# Altium footprint library FOOTPRINTS_tracker.PcbLib: 29 footprints (part 2 of 2)
Each footprint in its own frame and in the unit in brackets; x right, y up, seen from the top. Pads: shape width x height; smd on the part's side, far side on the other; paste and mask are expansions set on the pad; w line width, h text height; cw(c..) or ccw(c..) is an arc to the next point about the centre after c.
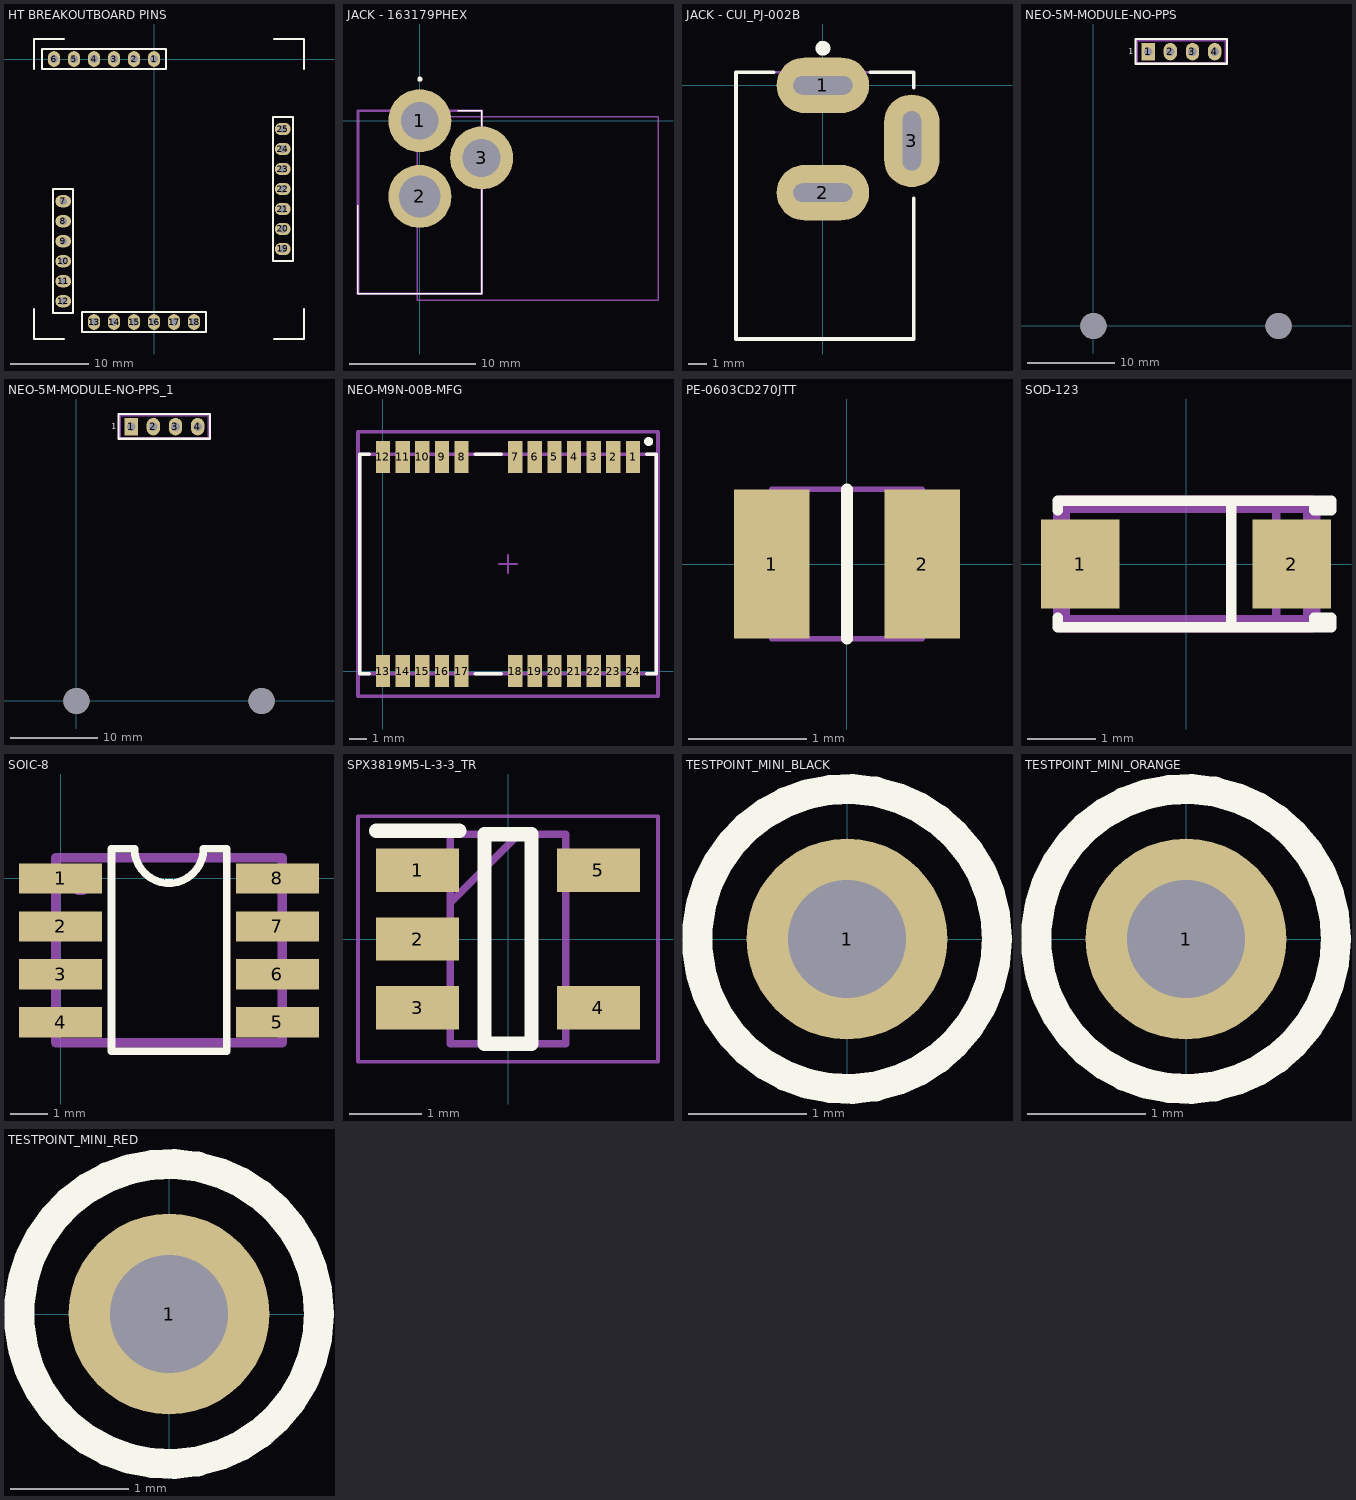
[diagram p1: the footprints below, top view; thin cyan lines are the x and y axes]

## HT BREAKOUTBOARD PINS [mm]
pads (25):
  oval 1.54x2 hole 1: 1(0,0) 2(-2.54,0) 3(-5.08,0) 4(-7.62,0) 5(-10.16,0) 6(-12.7,0) 13(-7.62,-33.401) 14(-5.08,-33.401) 15(-2.54,-33.401) 16(0,-33.401) 17(2.54,-33.401) 18(5.08,-33.401)
  oval 2x1.54 hole 1: 7(-11.532,-18.059) 8(-11.532,-20.599) 9(-11.532,-23.139) 10(-11.532,-25.679) 11(-11.532,-28.219) 12(-11.532,-30.759) 19(16.358,-24.13) 20(16.358,-21.59) 21(16.358,-19.05) 22(16.358,-16.51) 23(16.358,-13.97) 24(16.358,-11.43) 25(16.358,-8.89)
Top Overlay:
  lines w0.254: -15.24,-31.75 -15.24,-35.56 -11.43,-35.56 ; -15.24,-1.27 -15.24,2.54 -11.43,2.54 ; 15.088,-25.654 17.628,-25.654 ; 15.088,-25.65 15.088,-7.37 ; 15.088,-7.366 17.628,-7.366 ; 15.24,-35.56 19.05,-35.56 19.05,-31.75 ; 15.24,2.54 19.05,2.54 19.05,-1.27 ; 17.628,-25.65 17.628,-7.37 ; -14.224,-1.27 1.524,-1.27 1.524,1.27 -14.224,1.27 -14.224,-1.27 ; -12.802,-32.283 -12.802,-16.535 -10.262,-16.535 -10.262,-32.283 -12.802,-32.283 ; -9.144,-34.671 6.604,-34.671 6.604,-32.131 -9.144,-32.131 -9.144,-34.671
3D body "Female Header 7 pins.step": height 8.5, standoff -3, extent 15.088,-25.65 17.628,-7.37
3D body "Female Header 6 Pins.step": height 8.5, standoff -3, extent -14.195,-1.257 1.545,1.283
3D body "Female Header 6 Pins.step": height 8.5, standoff -3, extent -12.776,-32.19 -10.236,-16.451
3D body "Female Header 6 Pins.step": height 8.5, standoff -3, extent -9.115,-34.658 6.625,-32.118

## JACK - 163179PHEX [mm]
pads (3):
  round 5 hole 3: 1(0,0) 3(4.9,-2.95)
  round 5 hole 3.3: 2(0,-6)
Top Overlay:
  lines w0.1: -4.9,-6.7 -4.9,-13.7 4.9,-13.7 4.9,0.8 3,0.8
  lines w0.2: -0.1,3.3 ccw(c0,3.3) 0.1,3.3 ccw(c0,3.3) -0.1,3.3
Mechanical 15:
  lines w0.2: -4.9,-13.7 4.9,-13.7 4.9,0.8 -4.9,0.8 -4.9,-13.7
Mechanical 20:
  lines w0.1: -0.222,-14.218 -0.222,0.312 ; -0.222,-14.218 18.878,-14.218 ; -0.222,-14.218 -0.222,0.312 ; -0.222,-14.218 18.878,-14.218 ; -0.222,0.312 18.878,0.312 ; -0.222,0.312 18.878,0.312 ; 18.878,-14.218 18.878,0.312 ; 18.878,-14.218 18.878,0.312
3D body "163-179PH-EX.stp": height 10.85, standoff -3.65, extent -4.504,-13.7 4.996,0.8

## JACK - CUI_PJ-002B [mm]
pads (3):
  oval 5x3 hole 1 slot 3.2 at 0 deg: 1(0,0) 2(0,-5.8)
  oval 3x5 hole 1 slot 3.2 at 90 deg: 3(4.8,-3)
Top Overlay:
  circle w0.4: c0,2 r0.2
  lines w0.203: -2.65,0.7 -4.699,0.7 -4.699,-13.7 4.9,-13.7 4.9,-6.096 ; 2.55,0.7 4.9,0.7 4.9,-0.127
Mechanical 13:
  lines w0.127: -4.5,-13.7 4.5,-13.7 ; -4.5,0.7 4.5,0.7
3D body "PJ-002B--3DModel-STEP-56544.STEP": height 11.1, standoff -3.4, extent -4.446,-13.638 4.954,0.762

## NEO-5M-MODULE-NO-PPS [mm] "GPS NEM 5M MODUE WITHOUT PPS SIGNAL"
pads (6):
  rect 1.54x2 hole 1: 1(6.295,31.478)
  oval 1.54x2 hole 1: 2(8.835,31.478) 3(11.375,31.478) 4(13.915,31.478)
  round 3 hole 3 unplated: ""(0,0) ""(21.26,0)
Top Overlay:
  lines w0.254: 4.847,30.081 15.337,30.081 15.337,32.926 4.847,32.926 4.847,30.081
  text "1" at 4.009,31.148 h0.71
Mechanical 1:
  lines w0.2: 5.012,30.208 5.012,32.748 15.172,32.748 15.172,30.208 5.012,30.208
Mechanical 2:
  lines w0.2: 5.025,30.208 5.025,32.748 15.185,32.748 15.185,30.208 5.025,30.208
Top Designator:
  lines w0.2: 5.012,30.208 15.172,30.208 15.172,32.748 5.012,32.748 5.012,30.208
  text ".Designator" at 5.525,30.478 h0.61
3D body "female_header_a-bl254-eg-g04d.stp": height 8.5, standoff -3.2, extent 4.9,30.228 15.31,32.728
3D body "User Library-NEO-6M.STEP": height 21.01, standoff 9.07, extent -2.54,-2.54 23.8,33.02

## NEO-5M-MODULE-NO-PPS_1 [mm] "GPS NEM 5M MODUE WITHOUT PPS SIGNAL"
pads (6):
  rect 1.54x2 hole 1: 1(6.295,31.478)
  oval 1.54x2 hole 1: 2(8.835,31.478) 3(11.375,31.478) 4(13.915,31.478)
  round 3 hole 3 unplated: ""(0,0) ""(21.26,0)
Top Overlay:
  lines w0.254: 4.847,30.081 4.847,32.926 15.337,32.926 15.337,30.081 4.847,30.081
  text "1" at 4.009,31.148 h0.71
Mechanical 1:
  lines w0.2: 5.012,30.208 15.172,30.208 15.172,32.748 5.012,32.748 5.012,30.208
Mechanical 2:
  lines w0.2: 5.025,30.208 15.185,30.208 15.185,32.748 5.025,32.748 5.025,30.208
Top Designator:
  lines w0.2: 5.012,30.208 5.012,32.748 15.172,32.748 15.172,30.208 5.012,30.208
  text ".Designator" at 5.525,30.478 h0.61
3D body "female_header_a-bl254-eg-g04d.stp": height 8.5, standoff -3.2, extent 4.9,30.228 15.31,32.728

## NEO-M9N-00B-MFG [mm]
pads (24):
  rect 0.8x1.8 smd paste-1000 mask-1000: 1(14,12) 2(12.9,12) 3(11.8,12) 4(10.7,12) 5(9.6,12) 6(8.5,12) 7(7.4,12) 8(4.4,12) 9(3.3,12) 10(2.2,12) 11(1.1,12) 12(0,12) 13(0,0) 14(1.1,0) 15(2.2,0) 16(3.3,0) 17(4.4,0) 18(7.4,0) 19(8.5,0) 20(9.6,0) 21(10.7,0) 22(11.8,0) 23(12.9,0) 24(14,0)
Top Overlay:
  circle w0.25: c14.874,12.858 r0.125
  lines w0.2: -0.775,-0.15 -1.3,-0.15 -1.3,12.15 -0.775,12.15 ; 5.175,-0.15 6.625,-0.15 ; 5.175,12.15 6.625,12.15 ; 14.775,-0.15 15.3,-0.15 15.3,12.15 14.775,12.15
Top Solder:
  rectangle: -0.4,11.1 0.4,13.1
  rectangle: 0.7,11.1 1.5,13.1
  rectangle: 1.8,11.1 2.6,13.1
  rectangle: 2.9,11.1 3.7,13.1
  rectangle: 4,11.1 4.8,13.1
  rectangle: -0.4,-1.1 0.4,0.9
  rectangle: 0.7,-1.1 1.5,0.9
  rectangle: 1.8,-1.1 2.6,0.9
  rectangle: 2.9,-1.1 3.7,0.9
  rectangle: 4,-1.1 4.8,0.9
  rectangle: 13.6,-1.1 14.4,0.9
  rectangle: 12.5,-1.1 13.3,0.9
  rectangle: 11.4,-1.1 12.2,0.9
  rectangle: 10.3,-1.1 11.1,0.9
  rectangle: 9.2,-1.1 10,0.9
  rectangle: 8.1,-1.1 8.9,0.9
  rectangle: 7,-1.1 7.8,0.9
  rectangle: 13.6,11.1 14.4,13.1
  rectangle: 12.5,11.1 13.3,13.1
  rectangle: 11.4,11.1 12.2,13.1
  rectangle: 10.3,11.1 11.1,13.1
  rectangle: 9.2,11.1 10,13.1
  rectangle: 8.1,11.1 8.9,13.1
  rectangle: 7,11.1 7.8,13.1
Top Assembly:
  lines w0.2: -1.4,-1.4 15.4,-1.4 15.4,13.4 -1.4,13.4 -1.4,-1.4
  text ".Designator" at 7,6 h1
Top 3D Body:
  lines w0.2: -1.3,-0.15 15.3,-0.15 15.3,12.15 -1.3,12.15 -1.3,-0.15
Top Courtyard:
  lines w0.2: -1.4,-1.4 15.4,-1.4 15.4,13.4 -1.4,13.4 -1.4,-1.4
Top Component Center:
  lines w0.1: 6.5,6 7.5,6 ; 7,5.5 7,6.5
3D body "UNK_u-blox_NEO-M9N-00B_eec.STEP": height 0.25, standoff 0, extent -1.4,-1.4 15.4,13.4

## PE-0603CD270JTT [mm] "Capacitor 27 nH para NEO M9N"
pads (2):
  rect 0.64x1.27 smd: 1(-0.64,0) 2(0.64,0)
Top Overlay:
  lines w0.1: 0,-0.635 0,0.635
Mechanical 3:
  lines w0.05: -0.64,-0.635 0,-0.635 0.64,-0.635 ; -0.64,0.635 0.64,0.635 0,0.635

## SOD-123 [mm]
pads (2):
  rect 1.15x1.3 smd: 1(-1.55,0) 2(1.55,0)
Top Overlay:
  lines w0.152: -1.88,-0.787 -1.88,-0.927 1.88,-0.927 ; -1.88,0.787 -1.88,0.927 1.88,0.927 ; 0.662,-0.905 0.662,0.927 ; 1.88,-0.927 2.134,-0.927 2.134,-0.787 1.88,-0.787 1.88,-0.927 ; 1.88,0.927 2.134,0.927 2.134,0.787 1.88,0.787 1.88,0.927
Mechanical 1:
  lines w0.254: -1.825,-0.874 1.825,-0.874 1.843,-0.856 1.843,0.857 1.825,0.876 -1.825,0.876 -1.825,-0.874
Top Designator:
  lines w0.127: 1.325,-0.774 1.325,0.876 ; -1.825,-0.875 -1.825,0.875 1.825,0.875 1.843,0.857 1.843,-0.857 1.825,-0.875 -1.825,-0.875
  text ".Designator" at -1.609,-0.592 h0.61
3D body "SMF16A--3DModel-STEP-56544.STEP": height 1.05, standoff -0.05, extent -1.825,-0.875 1.825,0.875

## SOIC-8 [mm]
pads (8):
  rect 2.2x0.8 smd paste-0.03 mask+0.07: 1(0,0) 2(0,-1.27) 3(0,-2.54) 4(0,-3.81) 5(5.74,-3.81) 6(5.74,-2.54) 7(5.74,-1.27) 8(5.74,0)
Top Overlay:
  lines w0.203: 1.346,-4.572 1.346,0.787 1.956,0.787 ccw(c2.87,0.787) 3.784,0.787 4.394,0.787 4.394,-4.572 1.346,-4.572
Mechanical 1:
  lines w0.254: -0.13,-4.355 -0.13,0.545 5.87,0.545 5.87,-4.355 -0.13,-4.355
Top Designator:
  circle w0.254: c0.533,-0.102 r0.217
  lines w0.254: -0.13,-4.355 5.87,-4.355 ; -0.13,-4.355 -0.13,0.545 ; -0.13,-4.355 5.87,-4.355 ; -0.13,-4.355 -0.13,0.545 ; -0.13,0.545 5.87,0.545 ; -0.13,0.545 5.87,0.545 ; 5.87,-4.355 5.87,0.545 ; 5.87,-4.355 5.87,0.545
  text ".Designator" at 0.226,-2.118 h0.61
3D body "User Library-so8-3 (1).step": height 1.7, standoff 0, extent -0.13,-4.355 5.87,0.545

## SPX3819M5-L-3-3_TR [mm]
pads (5):
  rect 1.15x0.6 smd: 1(-1.25,0.95) 2(-1.25,0) 3(-1.25,-0.95) 4(1.25,-0.95) 5(1.25,0.95)
Top Overlay:
  lines w0.2: -1.825,1.5 -0.675,1.5 ; -0.325,-1.45 -0.325,1.45 0.325,1.45 0.325,-1.45 -0.325,-1.45
Mechanical 15:
  lines w0.1: -0.8,0.5 0.15,1.45 ; -0.8,-1.45 -0.8,1.45 0.8,1.45 0.8,-1.45 -0.8,-1.45
Mechanical 20:
  lines w0.05: -2.075,-1.7 -2.075,1.7 2.075,1.7 2.075,-1.7 -2.075,-1.7
3D body "SPX3819M5-L-3-3_TR.stp": height 1.45, standoff 0, extent -1.4,-1.45 1.4,1.45

## TESTPOINT_MINI_BLACK [mm]
pads (1):
  round 1.7 hole 1: 1(0,0)
Top Overlay:
  circle w0.254: c0,0 r1.27
Top Designator:
  text ".Designator" at -7.618,-0.508 h1.52
3D body "User Library-Test Point Keystone - 5001 BLACK.STEP": height 4.57, standoff -3.05, extent -1.27,-1.27 1.27,1.27

## TESTPOINT_MINI_ORANGE [mm]
pads (1):
  round 1.7 hole 1: 1(0,0)
Top Overlay:
  circle w0.254: c0,0 r1.27
Top Designator:
  text ".Designator" at -7.618,-0.508 h1.52
3D body "User Library-Test Point Keystone - 5003 ORANGE.STEP": height 4.57, standoff -3.05, extent -1.27,-1.27 1.27,1.27

## TESTPOINT_MINI_RED [mm]
pads (1):
  round 1.7 hole 1: 1(0,0)
Top Overlay:
  circle w0.254: c0,0 r1.27
Top Designator:
  text ".Designator" at -7.618,-0.508 h1.52
3D body "User Library-Test Point Keystone - 5000 RED.STEP": height 4.57, standoff -3.05, extent -1.27,-1.27 1.27,1.27